# Altium footprint library 全库.PcbLib: 967 footprints (part 7 of 61)
Each footprint in its own frame and in the unit in brackets; x right, y up, seen from the top. Pads: shape width x height; smd on the part's side, far side on the other; paste and mask are expansions set on the pad; w line width, h text height; cw(c..) or ccw(c..) is an arc to the next point about the centre after c.
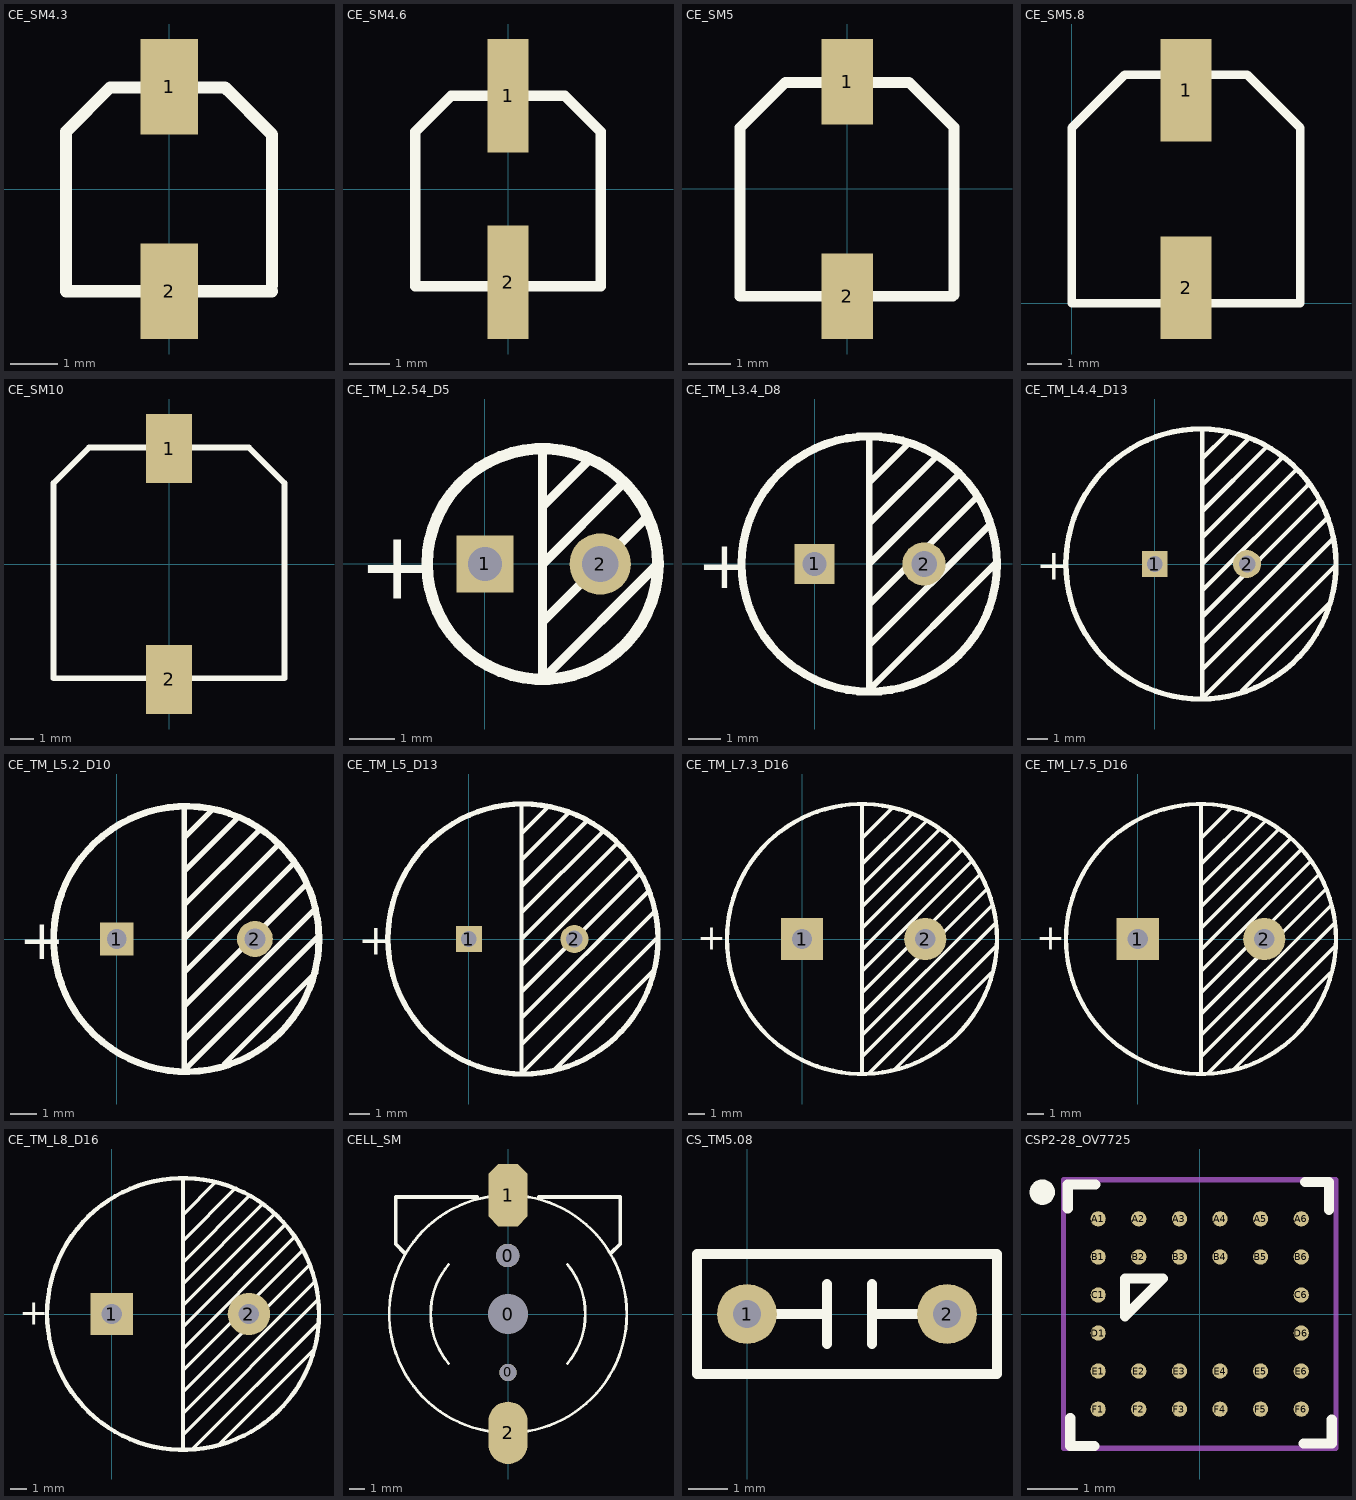
[diagram p6: the footprints below, top view; thin cyan lines are the x and y axes]

## CE_SM4.3 [mm]
pads (2):
  rect 1.2x2 smd: 1(0,2.14) 2(0,-2.14)
Top Overlay:
  lines w0.254: 1.213,2.079 2.14,1.152 ; 2.15,-2.14 -2.163,-2.14 -2.163,1.2 -1.236,2.127 1.165,2.127 2.15,1.142 2.15,-2.02

## CE_SM4.6 [mm]
height 3.5
pads (2):
  rect 1x2.8 smd: 1(0,2.3) 2(0,-2.3)
Top Overlay:
  lines w0.254: -2.286,-2.399 2.286,-2.399 2.286,1.411 1.397,2.3 -1.397,2.3 -2.286,1.411 -2.286,-2.399

## CE_SM5 [mm]
height 3.5
pads (2):
  rect 1.2x2 smd: 1(0,2.506) 2(0,-2.506)
Top Overlay:
  lines w0.254: -2.507,-2.506 -2.507,1.43 -1.443,2.494 1.443,2.494 2.494,1.443 2.494,-2.387 2.494,-2.479 2.467,-2.506 2.15,-2.506 -2.507,-2.506

## CE_SM5.8 [mm]
height 0.6
pads (2):
  rect 1.5x3 smd: 1(3.35,6.25) 2(3.35,0.45)
Top Overlay:
  lines w0.254: 6.7,5.05 6.7,5.15 ; 5.15,6.7 6.7,5.15 ; 5.15,6.7 6.7,5.15 ; 5.15,6.7 1.55,6.7 0,5.15 0,5.05 0,0 6.7,0 6.7,5.15

## CE_SM10 [mm]
pads (2):
  rect 2x3 smd: 1(0,5) 2(0,-5)
Top Overlay:
  lines w0.254: -5,-4.953 5,-4.953 5,3.509 3.462,5.047 -3.462,5.047 -5,3.509 -5,-4.953

## CE_TM_L2.54_D5 [mm]
height 3.5
pads (2):
  rect 1.25x1.25 hole 0.75: 1(0,0)
  round 1.35 hole 0.8: 2(2.54,0)
Top Overlay:
  circle w0.254: c1.27,0 r2.54
  lines w0.2: 1.27,-1.27 3.556,1.016 ; 1.27,0 3.048,1.778 ; 1.27,1.27 2.286,2.286 ; 1.27,2.54 1.27,-2.54 3.81,0 ; 3.81,0 3.81,0
  text "+" at -2.794,-0.762 h1.5

## CE_TM_L3.4_D8 [mm]
height 12
pads (2):
  rect 1.25x1.25 hole 0.75: 1(0,0)
  round 1.35 hole 0.8: 2(3.429,0)
Top Overlay:
  circle w0.254: c1.715,0 r4
  lines w0.2: 1.715,-2.54 5.525,1.27 ; 1.715,-1.27 5.017,2.032 ; 1.715,0 4.509,2.794 ; 1.715,1.27 3.747,3.302 ; 1.715,2.54 2.985,3.81 ; 1.715,3.937 1.715,-3.937 5.652,0 5.715,0
  text "+" at -3.683,-0.762 h1.5

## CE_TM_L4.4_D13 [mm]
height 21.4
pads (2):
  rect 1.25x1.25 hole 0.75: 1(0,0)
  round 1.35 hole 0.8: 2(4.445,0)
Top Overlay:
  circle w0.254: c2.223,0 r6.5
  lines w0.2: 2.286,-5.08 8.509,1.143 ; 2.286,-3.81 8.255,2.159 ; 2.286,-2.54 7.874,3.048 ; 2.286,-1.27 7.366,3.81 ; 2.286,0 6.731,4.445 ; 2.286,1.27 6.159,5.143 ; 2.286,2.54 5.334,5.588 ; 2.286,3.81 4.572,6.096 ; 2.286,5.08 3.492,6.286 ; 2.286,6.35 2.286,-6.477 8.723,-0.04 ; 4.191,-6.096 8.382,-1.905
  text "+" at -5.715,-0.762 h1.5

## CE_TM_L5.2_D10 [mm]
height 20
pads (2):
  rect 1.25x1.25 hole 0.75: 1(0,0)
  round 1.35 hole 0.8: 2(5.207,0)
Top Overlay:
  circle w0.254: c2.62,0 r5
  lines w0.2: 2.54,-3.81 7.493,1.143 ; 2.54,-2.54 7.112,2.032 ; 2.54,-1.27 6.604,2.794 ; 2.54,0 6.096,3.556 ; 2.54,1.27 5.334,4.064 ; 2.54,2.54 4.572,4.572 ; 2.54,3.81 3.556,4.826 ; 2.54,4.953 2.54,-4.953 7.62,0.127 7.62,0.254 ; 4.064,-4.699 7.493,-1.27
  text "+" at -3.683,-0.762 h1.5

## CE_TM_L5_D13 [mm]
height 21.4
pads (2):
  rect 1.25x1.25 hole 0.75: 1(0,0)
  round 1.35 hole 0.8: 2(5.08,0)
Top Overlay:
  circle w0.254: c2.604,0 r6.5
  lines w0.2: 2.54,-5.08 8.89,1.27 ; 2.54,-3.81 8.636,2.286 ; 2.54,-2.54 8.255,3.175 ; 2.54,-1.27 7.747,3.937 ; 2.54,0 7.112,4.572 ; 2.54,1.27 6.477,5.207 ; 2.54,2.54 5.715,5.715 ; 2.54,3.81 4.826,6.096 ; 2.54,5.08 3.81,6.35 ; 2.54,6.477 2.54,-6.477 9.017,0 ; 4.064,-6.35 8.89,-1.524
  text "+" at -5.334,-0.762 h1.5

## CE_TM_L7.3_D16 [mm]
height 3.16
pads (2):
  rect 2.5x2.5 hole 1.2: 1(0,0)
  round 2.5 hole 1.2: 2(7.306,0)
Top Overlay:
  circle w0.254: c3.556,0 r8
  lines w0.2: 3.556,-6.985 11.43,0.889 ; 3.556,-5.715 11.303,2.032 ; 3.556,-4.445 10.922,2.921 ; 3.556,-3.175 10.541,3.81 ; 3.556,-1.905 10.033,4.572 ; 3.556,-0.635 9.525,5.334 ; 3.556,0.635 8.89,5.969 ; 3.556,1.905 8.128,6.477 ; 3.556,3.175 7.366,6.985 ; 3.556,4.318 3.556,4.445 6.477,7.366 ; 3.556,5.842 3.556,5.969 5.334,7.747 ; 3.937,-8.001 11.557,-0.381 ; 5.461,-7.747 11.176,-2.032 11.303,-2.032
  lines w0.254: 3.556,-8.001 3.556,8.001
  text "+" at -6.223,-0.635 h1.5

## CE_TM_L7.5_D16 [mm]
height 3.16
pads (2):
  rect 2.5x2.5 hole 1.2: 1(0,0)
  round 2.5 hole 1.2: 2(7.5,0)
Top Overlay:
  circle w0.254: c3.75,0 r8
  lines w0.2: 3.75,-6.985 11.624,0.889 ; 3.75,-5.715 11.497,2.032 ; 3.75,-4.445 11.116,2.921 ; 3.75,-3.175 10.735,3.81 ; 3.75,-1.905 10.227,4.572 ; 3.75,-0.635 9.719,5.334 ; 3.75,0.635 9.084,5.969 ; 3.75,1.905 8.322,6.477 ; 3.75,3.175 7.56,6.985 ; 3.75,4.318 3.75,4.445 6.671,7.366 ; 3.75,5.842 3.75,5.969 5.528,7.747 ; 4.131,-8.001 11.751,-0.381 ; 5.655,-7.747 11.37,-2.032 11.497,-2.032
  lines w0.254: 3.75,-8.001 3.75,8.001
  text "+" at -6.029,-0.635 h1.5

## CE_TM_L8_D16 [mm]
height 2.6
pads (2):
  rect 2.5x2.5 hole 1.2: 1(0,0)
  round 2.5 hole 1.2: 2(8.068,0)
Top Overlay:
  circle w0.254: c4.192,0 r8
  lines w0.2: 4.191,-7.112 12.128,0.826 ; 4.191,-5.842 11.938,1.905 ; 4.191,-4.572 11.62,2.857 ; 4.191,-3.302 11.176,3.683 ; 4.191,-2.032 10.731,4.508 ; 4.191,0.508 9.525,5.842 ; 4.191,1.778 8.89,6.477 ; 4.191,3.048 8.128,6.985 ; 4.191,4.318 7.239,7.366 ; 4.191,5.842 6.096,7.747 ; 4.255,-0.699 10.16,5.207 ; 4.699,-8.001 12.192,-0.508 ; 6.223,-7.747 11.938,-2.032
  lines w0.254: 4.191,-8.001 4.191,8.001
  text "+" at -5.461,-0.635 h1.5

## CELL_SM [mm]
pads (5):
  round 1.5 hole 1.5: 0(-0.025,3.75)
  round 1.1 hole 1.1: 0(0,-3.75)
  round 2.54 hole 2.54: 0(0,0)
  oct 2.5x4 smd: 1(0,7.62)
  oval 2.5x4 smd: 2(0,-7.62)
Top Overlay:
  lines w0.178: -3.812,-3.172 cw(c0,0) -3.81,3.175 ; -0.833,-7.574 cw(c0,0) -0.833,7.574 ; 0.833,-7.574 ccw(c0,0) 7.62,0 ccw(c0,0) 0.833,7.574 ; 3.812,-3.172 ccw(c0,0) 3.815,3.169
  lines w0.254: -6.625,3.925 -7.2,4.5 -7.2,7.5 -2,7.5 ; 2,7.5 7.2,7.5 7.2,4.5 6.6,3.9

## CS_TM5.08 [mil]
pads (2):
  round 60 hole 27.56: 1(0,0) 2(200,0)
Top Overlay:
  lines w10: 25,0 80,0 ; 80,-30 80,30 ; 125,-30 125,30 ; 125,0 170,0 ; -50,-60 250,-60 250,60 -50,60 -50,-60

## CSP2-28_OV7725 [mm]
pads (28):
  round 0.3 smd mask+0.051: A1(-2,1.875) A2(-1.2,1.875) A3(-0.4,1.875) A4(0.4,1.875) A5(1.2,1.875) A6(2,1.875) B1(-2,1.125) B2(-1.2,1.125) B3(-0.4,1.125) B4(0.4,1.125) B5(1.2,1.125) B6(2,1.125) C1(-2,0.375) C6(2,0.375) D1(-2,-0.375) D6(2,-0.375) E1(-2,-1.125) E2(-1.2,-1.125) E3(-0.4,-1.125) E4(0.4,-1.125) E5(1.2,-1.125) E6(2,-1.125) F1(-2,-1.875) F2(-1.2,-1.875) F3(-0.4,-1.875) F4(0.4,-1.875) F5(1.2,-1.875) F6(2,-1.875)
Top Overlay:
  circle w0.25: c-3.1,2.4 r0.125
  lines w0.2: -2.6,2.075 -2.6,2.55 -2.05,2.55 ; -2.55,-2.05 -2.55,-2.6 -2.075,-2.6 ; 2.05,-2.55 2.6,-2.55 2.6,-2.075 ; 2.075,2.6 2.55,2.6 2.55,2.05 ; -1.475,-0.05 -1.475,0.7 -0.725,0.7 -1.475,-0.05
Mechanical 13:
  lines w0.1: -2.685,-2.645 2.685,-2.645 2.685,2.645 -2.685,2.645 -2.685,-2.645